# Altium footprint library SWARMUS_LIB.PcbLib: 114 footprints (part 2 of 8)
Each footprint in its own frame and in the unit in brackets; x right, y up, seen from the top. Pads: shape width x height; smd on the part's side, far side on the other; paste and mask are expansions set on the pad; w line width, h text height; cw(c..) or ccw(c..) is an arc to the next point about the centre after c.
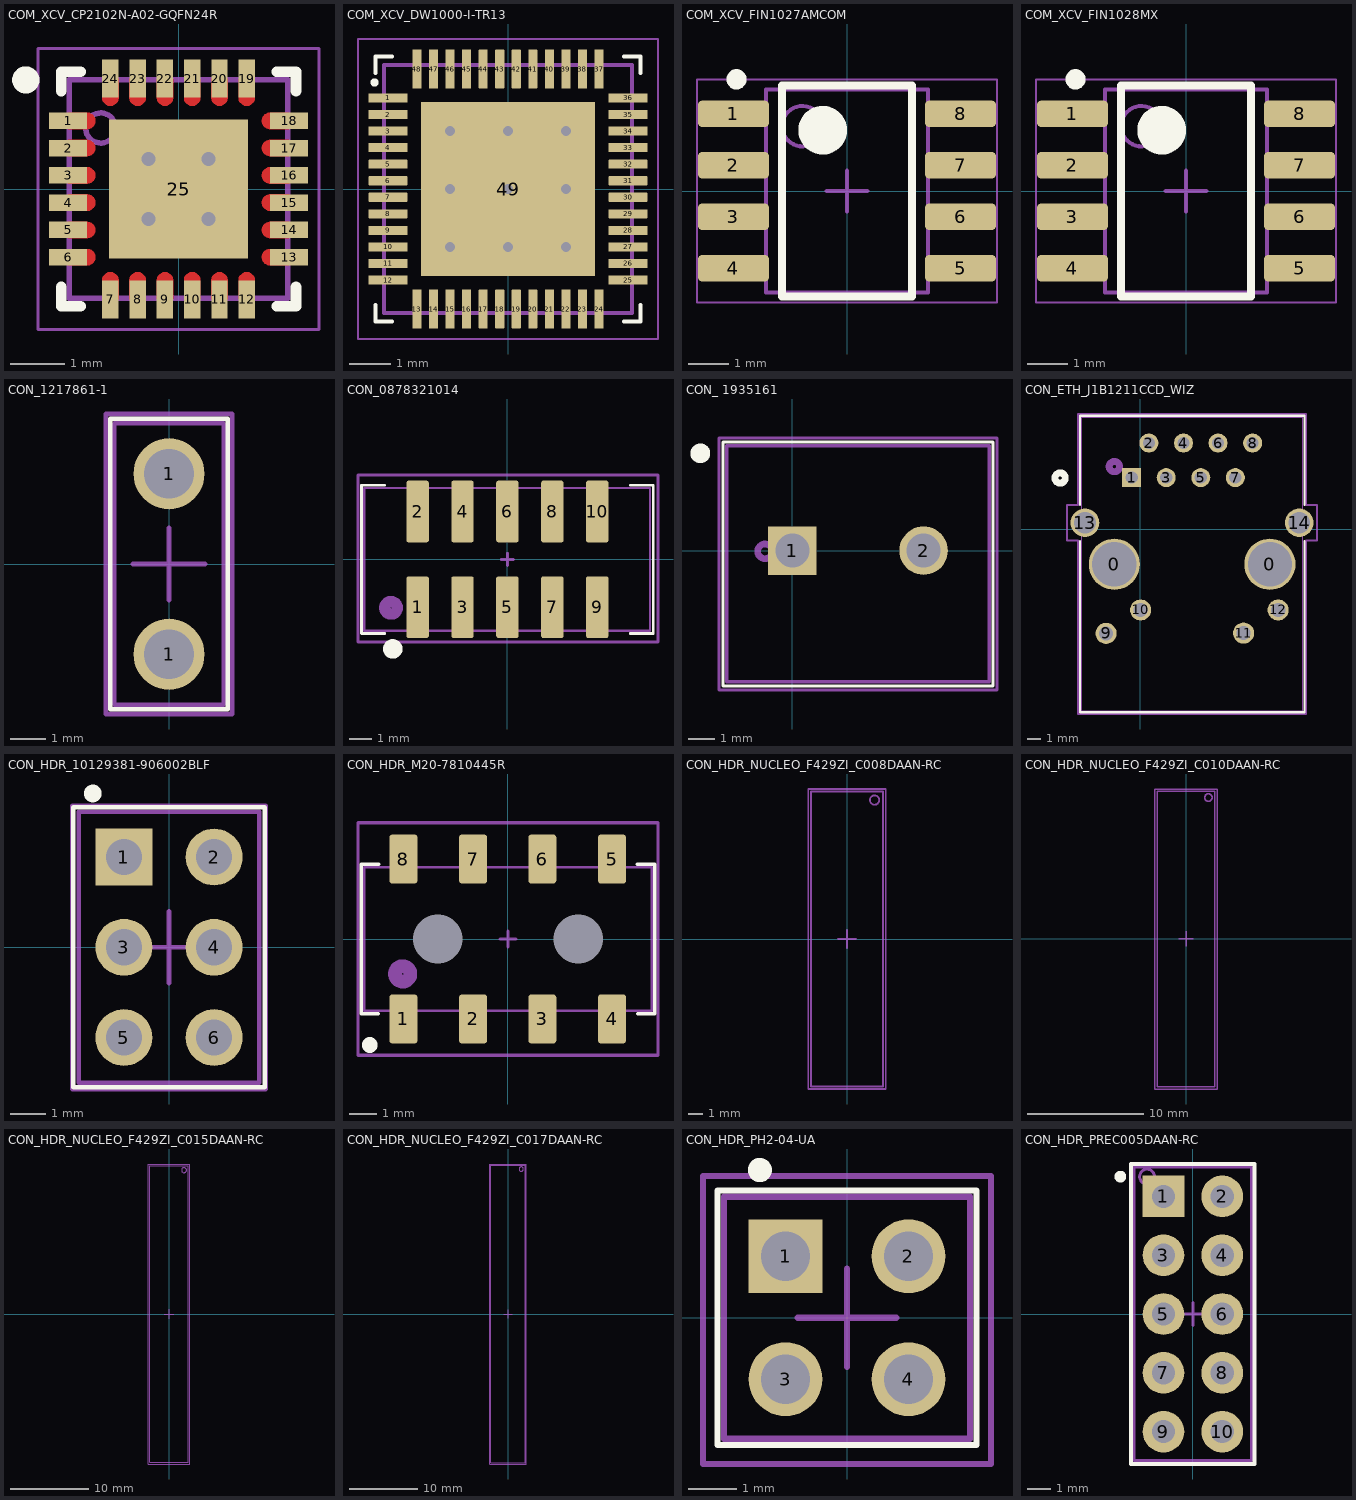
[diagram p1: the footprints below, top view; thin cyan lines are the x and y axes]

## COM_XCV_CP2102N-A02-GQFN24R [mm] "QFN, 24-Leads, Body 4.00x4.00mm, Pitch 0.50mm, Thermal Pad 2.55x2.55mm, IPC Medium Density"
height 0.8
pads (25):
  rect 0.7x0.3 smd paste-0.025 mask+0.05: 1(-2.025,1.25) 2(-2.025,0.75) 3(-2.025,0.25) 4(-2.025,-0.25) 5(-2.025,-0.75) 6(-2.025,-1.25) 13(2.025,-1.25) 14(2.025,-0.75) 15(2.025,-0.25) 16(2.025,0.25) 17(2.025,0.75) 18(2.025,1.25)
  rect 0.3x0.7 smd paste-0.025 mask+0.05: 7(-1.25,-2.025) 8(-0.75,-2.025) 9(-0.25,-2.025) 10(0.25,-2.025) 11(0.75,-2.025) 12(1.25,-2.025) 19(1.25,2.025) 20(0.75,2.025) 21(0.25,2.025) 22(-0.25,2.025) 23(-0.75,2.025) 24(-1.25,2.025)
  rect 2.55x2.55 smd paste-0.025 mask+0.05: 25(0,0)
via -0.55,0.55 diameter 0.508 hole 0.254
via 0.55,0.55 diameter 0.508 hole 0.254
via -0.55,-0.55 diameter 0.508 hole 0.254
via 0.55,-0.55 diameter 0.508 hole 0.254
Top Layer:
  region: -1.675,-1.4 -1.66,-1.4 -1.631,-1.394 -1.604,-1.383 -1.579,-1.367 -1.558,-1.346 -1.542,-1.321 -1.531,-1.294 -1.525,-1.265 -1.525,-1.235 -1.531,-1.206 -1.542,-1.179 -1.558,-1.154 -1.579,-1.133 -1.604,-1.117 -1.631,-1.106 -1.66,-1.1 -1.675,-1.1 -2.025,-1.1 -2.025,-1.4
  region: 0.6,1.675 0.6,1.66 0.606,1.631 0.617,1.604 0.633,1.579 0.654,1.558 0.679,1.542 0.706,1.531 0.735,1.525 0.765,1.525 0.794,1.531 0.821,1.542 0.846,1.558 0.867,1.579 0.883,1.604 0.894,1.631 0.9,1.66 0.9,1.675 0.9,2.025 0.6,2.025
  region: 0.1,1.675 0.1,1.66 0.106,1.631 0.117,1.604 0.133,1.579 0.154,1.558 0.179,1.542 0.206,1.531 0.235,1.525 0.265,1.525 0.294,1.531 0.321,1.542 0.346,1.558 0.367,1.579 0.383,1.604 0.394,1.631 0.4,1.66 0.4,1.675 0.4,2.025 0.1,2.025
  region: -0.4,1.675 -0.4,1.66 -0.394,1.631 -0.383,1.604 -0.367,1.579 -0.346,1.558 -0.321,1.542 -0.294,1.531 -0.265,1.525 -0.235,1.525 -0.206,1.531 -0.179,1.542 -0.154,1.558 -0.133,1.579 -0.117,1.604 -0.106,1.631 -0.1,1.66 -0.1,1.675 -0.1,2.025 -0.4,2.025
  region: -0.9,1.675 -0.9,1.66 -0.894,1.631 -0.883,1.604 -0.867,1.579 -0.846,1.558 -0.821,1.542 -0.794,1.531 -0.765,1.525 -0.735,1.525 -0.706,1.531 -0.679,1.542 -0.654,1.558 -0.633,1.579 -0.617,1.604 -0.606,1.631 -0.6,1.66 -0.6,1.675 -0.6,2.025 -0.9,2.025
  region: -1.4,1.675 -1.4,1.66 -1.394,1.631 -1.383,1.604 -1.367,1.579 -1.346,1.558 -1.321,1.542 -1.294,1.531 -1.265,1.525 -1.235,1.525 -1.206,1.531 -1.179,1.542 -1.154,1.558 -1.133,1.579 -1.117,1.604 -1.106,1.631 -1.1,1.66 -1.1,1.675 -1.1,2.025 -1.4,2.025
  region: 1.1,1.675 1.1,1.66 1.106,1.631 1.117,1.604 1.133,1.579 1.154,1.558 1.179,1.542 1.206,1.531 1.235,1.525 1.265,1.525 1.294,1.531 1.321,1.542 1.346,1.558 1.367,1.579 1.383,1.604 1.394,1.631 1.4,1.66 1.4,1.675 1.4,2.025 1.1,2.025
  region: 1.675,-0.6 1.66,-0.6 1.631,-0.606 1.604,-0.617 1.579,-0.633 1.558,-0.654 1.542,-0.679 1.531,-0.706 1.525,-0.735 1.525,-0.765 1.531,-0.794 1.542,-0.821 1.558,-0.846 1.579,-0.867 1.604,-0.883 1.631,-0.894 1.66,-0.9 1.675,-0.9 2.025,-0.9 2.025,-0.6
  region: 1.675,-0.1 1.66,-0.1 1.631,-0.106 1.604,-0.117 1.579,-0.133 1.558,-0.154 1.542,-0.179 1.531,-0.206 1.525,-0.235 1.525,-0.265 1.531,-0.294 1.542,-0.321 1.558,-0.346 1.579,-0.367 1.604,-0.383 1.631,-0.394 1.66,-0.4 1.675,-0.4 2.025,-0.4 2.025,-0.1
  region: 1.675,0.4 1.66,0.4 1.631,0.394 1.604,0.383 1.579,0.367 1.558,0.346 1.542,0.321 1.531,0.294 1.525,0.265 1.525,0.235 1.531,0.206 1.542,0.179 1.558,0.154 1.579,0.133 1.604,0.117 1.631,0.106 1.66,0.1 1.675,0.1 2.025,0.1 2.025,0.4
  region: 1.675,0.9 1.66,0.9 1.631,0.894 1.604,0.883 1.579,0.867 1.558,0.846 1.542,0.821 1.531,0.794 1.525,0.765 1.525,0.735 1.531,0.706 1.542,0.679 1.558,0.654 1.579,0.633 1.604,0.617 1.631,0.606 1.66,0.6 1.675,0.6 2.025,0.6 2.025,0.9
  region: 1.675,1.4 1.66,1.4 1.631,1.394 1.604,1.383 1.579,1.367 1.558,1.346 1.542,1.321 1.531,1.294 1.525,1.265 1.525,1.235 1.531,1.206 1.542,1.179 1.558,1.154 1.579,1.133 1.604,1.117 1.631,1.106 1.66,1.1 1.675,1.1 2.025,1.1 2.025,1.4
  region: 1.675,-1.1 1.66,-1.1 1.631,-1.106 1.604,-1.117 1.579,-1.133 1.558,-1.154 1.542,-1.179 1.531,-1.206 1.525,-1.235 1.525,-1.265 1.531,-1.294 1.542,-1.321 1.558,-1.346 1.579,-1.367 1.604,-1.383 1.631,-1.394 1.66,-1.4 1.675,-1.4 2.025,-1.4 2.025,-1.1
  region: -0.6,-1.675 -0.6,-1.66 -0.606,-1.631 -0.617,-1.604 -0.633,-1.579 -0.654,-1.558 -0.679,-1.542 -0.706,-1.531 -0.735,-1.525 -0.765,-1.525 -0.794,-1.531 -0.821,-1.542 -0.846,-1.558 -0.867,-1.579 -0.883,-1.604 -0.894,-1.631 -0.9,-1.66 -0.9,-1.675 -0.9,-2.025 -0.6,-2.025
  region: -0.1,-1.675 -0.1,-1.66 -0.106,-1.631 -0.117,-1.604 -0.133,-1.579 -0.154,-1.558 -0.179,-1.542 -0.206,-1.531 -0.235,-1.525 -0.265,-1.525 -0.294,-1.531 -0.321,-1.542 -0.346,-1.558 -0.367,-1.579 -0.383,-1.604 -0.394,-1.631 -0.4,-1.66 -0.4,-1.675 -0.4,-2.025 -0.1,-2.025
  region: 0.4,-1.675 0.4,-1.66 0.394,-1.631 0.383,-1.604 0.367,-1.579 0.346,-1.558 0.321,-1.542 0.294,-1.531 0.265,-1.525 0.235,-1.525 0.206,-1.531 0.179,-1.542 0.154,-1.558 0.133,-1.579 0.117,-1.604 0.106,-1.631 0.1,-1.66 0.1,-1.675 0.1,-2.025 0.4,-2.025
  region: 0.9,-1.675 0.9,-1.66 0.894,-1.631 0.883,-1.604 0.867,-1.579 0.846,-1.558 0.821,-1.542 0.794,-1.531 0.765,-1.525 0.735,-1.525 0.706,-1.531 0.679,-1.542 0.654,-1.558 0.633,-1.579 0.617,-1.604 0.606,-1.631 0.6,-1.66 0.6,-1.675 0.6,-2.025 0.9,-2.025
  region: 1.4,-1.675 1.4,-1.66 1.394,-1.631 1.383,-1.604 1.367,-1.579 1.346,-1.558 1.321,-1.542 1.294,-1.531 1.265,-1.525 1.235,-1.525 1.206,-1.531 1.179,-1.542 1.154,-1.558 1.133,-1.579 1.117,-1.604 1.106,-1.631 1.1,-1.66 1.1,-1.675 1.1,-2.025 1.4,-2.025
  region: -1.1,-1.675 -1.1,-1.66 -1.106,-1.631 -1.117,-1.604 -1.133,-1.579 -1.154,-1.558 -1.179,-1.542 -1.206,-1.531 -1.235,-1.525 -1.265,-1.525 -1.294,-1.531 -1.321,-1.542 -1.346,-1.558 -1.367,-1.579 -1.383,-1.604 -1.394,-1.631 -1.4,-1.66 -1.4,-1.675 -1.4,-2.025 -1.1,-2.025
  region: -1.675,0.6 -1.66,0.6 -1.631,0.606 -1.604,0.617 -1.579,0.633 -1.558,0.654 -1.542,0.679 -1.531,0.706 -1.525,0.735 -1.525,0.765 -1.531,0.794 -1.542,0.821 -1.558,0.846 -1.579,0.867 -1.604,0.883 -1.631,0.894 -1.66,0.9 -1.675,0.9 -2.025,0.9 -2.025,0.6
  region: -1.675,0.1 -1.66,0.1 -1.631,0.106 -1.604,0.117 -1.579,0.133 -1.558,0.154 -1.542,0.179 -1.531,0.206 -1.525,0.235 -1.525,0.265 -1.531,0.294 -1.542,0.321 -1.558,0.346 -1.579,0.367 -1.604,0.383 -1.631,0.394 -1.66,0.4 -1.675,0.4 -2.025,0.4 -2.025,0.1
  region: -1.675,-0.4 -1.66,-0.4 -1.631,-0.394 -1.604,-0.383 -1.579,-0.367 -1.558,-0.346 -1.542,-0.321 -1.531,-0.294 -1.525,-0.265 -1.525,-0.235 -1.531,-0.206 -1.542,-0.179 -1.558,-0.154 -1.579,-0.133 -1.604,-0.117 -1.631,-0.106 -1.66,-0.1 -1.675,-0.1 -2.025,-0.1 -2.025,-0.4
  region: -1.675,-0.9 -1.66,-0.9 -1.631,-0.894 -1.604,-0.883 -1.579,-0.867 -1.558,-0.846 -1.542,-0.821 -1.531,-0.794 -1.525,-0.765 -1.525,-0.735 -1.531,-0.706 -1.542,-0.679 -1.558,-0.654 -1.579,-0.633 -1.604,-0.617 -1.631,-0.606 -1.66,-0.6 -1.675,-0.6 -2.025,-0.6 -2.025,-0.9
  region: -1.675,1.1 -1.66,1.1 -1.631,1.106 -1.604,1.117 -1.579,1.133 -1.558,1.154 -1.542,1.179 -1.531,1.206 -1.525,1.235 -1.525,1.265 -1.531,1.294 -1.542,1.321 -1.558,1.346 -1.579,1.367 -1.604,1.383 -1.631,1.394 -1.66,1.4 -1.675,1.4 -2.025,1.4 -2.025,1.1
Top Overlay:
  circle w0.25: c-2.8,2 r0.125
  lines w0.2: -2.15,-1.8 -2.15,-2.15 -1.8,-2.15 ; -2.15,1.8 -2.15,2.15 -1.8,2.15 ; 1.8,-2.15 2.15,-2.15 2.15,-1.8 ; 1.8,2.15 2.15,2.15 2.15,1.8
Top Solder:
  drawing of 24 lines, arcs and shapes, not listed
Top Assembly Drawing:
  circle w0.1: c-1.427,1.118 r0.276
  lines w0.1: -2,-2 -2,2 2,2 2,-2 -2,-2
Top Courtyard:
  lines w0.05: -2.575,-2.575 -2.575,2.575 2.575,2.575 2.575,-2.575 -2.575,-2.575
  lines w0.1: -0.5,0 0.5,0 ; 0,-0.5 0,0.5
3D body: height 0.8, standoff 0, extent -2,-2 2,2

## COM_XCV_DW1000-I-TR13 [mm] "QFN 48 package, 0.5mm pitch"
height 1
pads (49):
  rrect20% 0.95x0.22 smd paste-0.025 mask+0.04: 1(-2.9,2.2) 2(-2.9,1.8) 3(-2.9,1.4) 4(-2.9,1) 5(-2.9,0.6) 6(-2.9,0.2) 7(-2.9,-0.2) 8(-2.9,-0.6) 9(-2.9,-1) 10(-2.9,-1.4) 11(-2.9,-1.8) 12(-2.9,-2.2) 25(2.9,-2.2) 26(2.9,-1.8) 27(2.9,-1.4) 28(2.9,-1) 29(2.9,-0.6) 30(2.9,-0.2) 31(2.9,0.2) 32(2.9,0.6) 33(2.9,1) 34(2.9,1.4) 35(2.9,1.8) 36(2.9,2.2)
  rrect20% 0.22x0.95 smd paste-0.025 mask+0.04: 13(-2.2,-2.9) 14(-1.8,-2.9) 15(-1.4,-2.9) 16(-1,-2.9) 17(-0.6,-2.9) 18(-0.2,-2.9) 19(0.2,-2.9) 20(0.6,-2.9) 21(1,-2.9) 22(1.4,-2.9) 23(1.8,-2.9) 24(2.2,-2.9) 37(2.2,2.9) 38(1.8,2.9) 39(1.4,2.9) 40(1,2.9) 41(0.6,2.9) 42(0.2,2.9) 43(-0.2,2.9) 44(-0.6,2.9) 45(-1,2.9) 46(-1.4,2.9) 47(-1.8,2.9) 48(-2.2,2.9)
  rect 4.2x4.2 smd paste-5 mask+0.07: 49(0,0)
via 1.4,1.4 diameter 0.5 hole 0.25
via 1.4,0 diameter 0.5 hole 0.25
via 1.4,-1.4 diameter 0.5 hole 0.25
via 0,-1.4 diameter 0.5 hole 0.25
via -1.4,-1.4 diameter 0.5 hole 0.25
via -1.4,-0.002 diameter 0.5 hole 0.25
via -1.4,1.4 diameter 0.5 hole 0.25
via 0,1.4 diameter 0.5 hole 0.25
via 0,0 diameter 0.5 hole 0.25
Top Overlay:
  circle w0.1: c-3.225,2.575 r0.05
  lines w0.1: -3.2,-2.8 -3.2,-3.2 -2.8,-3.2 ; -3.2,2.8 -3.2,3.2 -2.8,3.2 ; 2.8,-3.2 3.2,-3.2 3.2,-2.8 ; 2.8,3.2 3.2,3.2 3.2,2.8
Top Paste:
  region: 0.175,-0.175 0.175,-1.925 1.925,-1.925 1.925,-0.175
  region: -0.175,-0.175 -1.925,-0.175 -1.925,-1.925 -0.175,-1.925
  region: -0.175,0.175 -0.175,1.925 -1.925,1.925 -1.925,0.175
  rectangle: 0.175,0.175 1.925,1.925
Top Assembly Drawing:
  circle w0.1: c-2.6,2.2 r0.05
  lines w0.1: -3,-3 -3,3 3,3 3,-3 -3,-3
Top Courtyard:
  lines w0.05: -3.625,-3.625 3.625,-3.625 3.625,3.625 -3.625,3.625 -3.625,-3.625
  lines w0.1: 0,0.2 0,-0.2 0,0 -0.2,0 0.2,0 ; 0.201,0 0.202,-0.002
3D body "DW1000-I-TR13.stp": height 0.9, standoff 0, extent -3.05,-3.05 3.05,3.05

## COM_XCV_FIN1027AMCOM [mm] "8-SOIC"
height 1.75
pads (8):
  rrect30% 1.75x0.65 smd paste-0.025 mask+0.07: 1(-2.8,1.905) 2(-2.8,0.635) 3(-2.8,-0.635) 4(-2.8,-1.905) 5(2.8,-1.905) 6(2.8,-0.635) 7(2.8,0.635) 8(2.8,1.905)
Top Overlay:
  circle w0.6: c-0.6,1.5 r0.3
  circle w0.25: c-2.725,2.755 r0.125
  lines w0.2: -1.6,-2.6 1.6,-2.6 1.6,2.6 -1.6,2.6 -1.6,-2.6
Top Assembly Drawing:
  circle w0.1: c-1.1,1.6 r0.5
  lines w0.1: -2,-2.5 2,-2.5 2,2.5 -2,2.5 -2,-2.5
Top Courtyard:
  lines w0.05: -3.7,-2.75 3.7,-2.75 3.7,2.75 -3.7,2.75 -3.7,-2.75
  lines w0.1: -0.5,0 0.5,0 ; 0,-0.5 0,0.5
3D body "SOIC127P600X175-8N.step": height 1.75, standoff 0, extent -3,-2.5 3,2.5

## COM_XCV_FIN1028MX [mm] "8-SOIC"
height 1.75
pads (8):
  rrect30% 1.75x0.65 smd paste-0.025 mask+0.07: 1(-2.8,1.905) 2(-2.8,0.635) 3(-2.8,-0.635) 4(-2.8,-1.905) 5(2.8,-1.905) 6(2.8,-0.635) 7(2.8,0.635) 8(2.8,1.905)
Top Overlay:
  circle w0.25: c-2.725,2.755 r0.125
  circle w0.6: c-0.6,1.5 r0.3
  lines w0.2: -1.6,-2.6 -1.6,2.6 1.6,2.6 1.6,-2.6 -1.6,-2.6
Top Assembly Drawing:
  circle w0.1: c-1.1,1.6 r0.5
  lines w0.1: -2,-2.5 -2,2.5 2,2.5 2,-2.5 -2,-2.5
Top Courtyard:
  lines w0.05: -3.7,-2.75 -3.7,2.75 3.7,2.75 3.7,-2.75 -3.7,-2.75
  lines w0.1: -0.5,0 0.5,0 ; 0,-0.5 0,0.5
3D body "SOIC127P600X175-8N.step": height 1.75, standoff 0, extent -3,-2.5 3,2.5

## CON_1217861-1 [mm]
pads (2):
  round 2 hole 1.4: 1(0,-2.54) 1(0,2.54)
Top Overlay:
  lines w0.127: -1.65,-4.091 1.65,-4.091 1.65,4.091 -1.65,4.091 -1.65,-4.091
Top Assembly Drawing:
  lines w0.127: -1.543,-3.962 1.543,-3.962 1.543,3.962 -1.543,3.962 -1.543,-3.962
Top Courtyard:
  lines w0.127: -1.016,0 1.016,0 ; 0,-1.016 0,1.016 ; -1.779,-4.222 1.779,-4.222 1.779,4.222 -1.779,4.222 -1.779,-4.222
3D body "1217861-1--3DModel-STEP-1.STEP": height 10.21, standoff -3.81, extent -1.543,-3.962 1.543,3.962

## CON_0878321014 [mm]
pads (10):
  rrect20% 1x2.75 smd: 1(-4,-2.13) 2(-4,2.13) 3(-2,-2.13) 4(-2,2.13) 5(0,-2.13) 6(0,2.13) 7(2,-2.13) 8(2,2.13) 9(4,-2.13) 10(4,2.13)
Top Overlay:
  circle w0.5: c-5.105,-3.988 r0.184
  lines w0.127: -5.467,-3.302 -6.492,-3.302 -6.492,3.302 -5.467,3.302 ; 5.467,-3.302 6.492,-3.302 6.492,3.302 5.467,3.302
Top Assembly Drawing:
  circle w0.5: c-5.182,-2.159 r0.279
  lines w0.1: -6.375,-3.175 6.35,-3.175 6.35,3.175 -6.375,3.175 -6.375,-3.175
Top Courtyard:
  lines w0.127: -0.275,0 0.275,0 ; 0,-0.275 0,0.275 ; -6.655,-3.683 -6.655,3.759 6.706,3.759 6.706,-3.683 -6.655,-3.683
3D body "878321014.stp": height 9.05, standoff 0, extent -6.325,-3.175 6.325,3.175

## CON_ 1935161 [mm]
pads (2):
  rect 1.85x1.85 hole 1.3: 1(0,0)
  round 1.85 hole 1.3: 2(5,0)
Top Overlay:
  circle w0.5: c-3.505,3.708 r0.127
  lines w0.127: -2.642,-5.156 7.645,-5.156 7.645,4.14 -2.642,4.14 -2.642,-5.156
Top Assembly Drawing:
  circle w0.254: c-1.041,-0.025 r0.281
  lines w0.127: -2.5,-5 7.5,-5 7.5,4 -2.5,4 -2.5,-5
Top Courtyard:
  lines w0.127: -2.794,-5.309 7.798,-5.309 7.798,4.293 -2.794,4.293 -2.794,-5.309
3D body "pxc_1935161_04_PT-1-5-2-5-0-H_3D.stp": height 11.4, standoff -3.5, extent -2.5,-5 8.07,4

## CON_ETH_J1B1211CCD_WIZ [mil] "ETH with mags"
pads (16):
  round 148 hole 128: 0(-75,-101.57) 0(375,-101.57)
  rect 55x55 / inner round 55 / far side round 55 hole 35.43 mask+0: 1(-25,149.21)
  round 55 hole 35.43 mask+0: 2(25,249.21) 3(75,149.21) 4(125,249.21) 5(175,149.21) 6(225,249.21) 7(275,149.21) 8(325,249.21)
  round 61 hole 41: 9(-99.02,-301.57) 10(0.98,-233.86) 11(299.02,-300.79) 12(399.02,-233.86)
  round 83 hole 63: 13(-160.04,18.5) 14(460.04,18.5)
Top Overlay:
  circle w20: c-232,148 r15
  lines w6: -175,-34.01 -175,-529.79 475,-529.79 475,-34.01 ; -175,70 -175,328.21 475,328.21 475,70
Top 3D Model:
  circle w20: c-75,181 r15
  lines w1: -170,-524.79 470,-524.79 470,323.21 -170,323.21 -170,-524.79
Top Courtyard:
  lines w6: -211.54,-33 -211.54,70 -180,70 -180,333.21 480,333.21 480,70 511.54,70 511.54,-33 480,-33 480,-534.79 -180,-534.79 -180,-33 -211.54,-33
3D body: height 10, standoff 0, extent 0,0 10,10
3D body "J1B1211CCD.STEP": height 565.33, standoff -155.51, extent -203.69,-525.29 505.7,313.29

## CON_HDR_10129381-906002BLF [mm] "2x3 100mils header"
pads (6):
  rect 1.6x1.6 hole 1.016 mask+0.07: 1(-1.27,2.54)
  round 1.6 hole 1.016 mask+0.07: 2(1.27,2.54) 3(-1.27,0) 4(1.27,0) 5(-1.27,-2.54) 6(1.27,-2.54)
Top Overlay:
  circle w0.25: c-2.144,4.329 r0.125
  lines w0.127: -2.692,-3.937 -2.692,3.937 2.692,3.937 2.692,-3.937 -2.692,-3.937
Top Assembly Drawing:
  lines w0.127: -2.54,-3.81 -2.54,3.81 2.54,3.81 2.54,-3.81 -2.54,-3.81
Top Courtyard:
  lines w0.127: -1.016,0 1.016,0 ; 0,-1.016 0,1.016 ; -2.718,-3.988 2.718,-3.988 2.718,3.988 -2.718,3.988 -2.718,-3.988
3D body "s10129381-X06002XLF.stp": height 8.18, standoff -2.49, extent -2.415,-3.81 2.415,3.81

## CON_HDR_M20-7810445R [mm]
pads (10):
  rrect20% 1.02x1.78 smd paste-0.025 mask+0.07: 1(-3.81,-2.91) 2(-1.27,-2.911) 3(1.248,-2.911) 4(3.788,-2.911) 5(3.788,2.91) 6(1.248,2.91) 7(-1.27,2.91) 8(-3.81,2.91)
  round 1 hole 1.8: ""(-2.554,0) ""(2.554,0)
Top Overlay:
  circle w0.5: c-5.029,-3.861 r0.036
  lines w0.127: -4.73,-2.718 -5.334,-2.718 -5.334,2.718 -4.705,2.718 ; 4.705,2.718 5.334,2.718 5.334,-2.718 4.73,-2.718
Top Assembly Drawing:
  circle w0.5: c-3.835,-1.27 r0.279
  lines w0.1: -5.23,-2.615 5.23,-2.615 5.23,2.615 -5.23,2.615 -5.23,-2.615
Top Courtyard:
  lines w0.127: -0.275,0 0.275,0 ; 0,-0.275 0,0.275 ; -5.461,-4.225 5.461,-4.225 5.461,4.225 -5.461,4.225 -5.461,-4.225
3D body "M20-7810445R_v1 v1.step": height 3.75, standoff -1.4, extent -5.08,-3.625 5.08,3.575

## CON_HDR_NUCLEO_F429ZI_C008DAAN-RC [mm]
Top Assembly Drawing:
  circle w0.127: c1.9,9.575 r0.322
  lines w0.127: -0.635,0 0.635,0 ; 0,-0.635 0,0.635 ; -2.476,-10.16 -2.476,10.16 2.476,10.16 2.476,-10.16 -2.476,-10.16
Top Courtyard:
  lines w0.127: -2.667,-10.338 -2.667,10.338 2.667,10.338 2.667,-10.338 -2.667,-10.338
3D body "C008DAAN-RC.STEP": height 8.37, standoff -3.02, extent -2.5,-10.16 2.5,10.16

## CON_HDR_NUCLEO_F429ZI_C010DAAN-RC [mm]
Top Assembly Drawing:
  circle w0.127: c1.93,12.141 r0.322
  lines w0.127: -0.635,0 0.635,0 ; 0,-0.635 0,0.635 ; -2.476,-12.7 2.476,-12.7 2.476,12.7 -2.476,12.7 -2.476,-12.7
Top Courtyard:
  lines w0.127: -2.667,-12.903 2.667,-12.903 2.667,12.878 -2.667,12.878 -2.667,-12.903
3D body "C010DAAN-RC.STEP": height 8.37, standoff -3.02, extent -2.5,-12.7 2.5,12.7

## CON_HDR_NUCLEO_F429ZI_C015DAAN-RC [mm]
Top Assembly Drawing:
  circle w0.127: c1.93,18.466 r0.322
  lines w0.127: -0.635,0 0.635,0 ; 0,-0.635 0,0.635 ; -2.476,-19.05 -2.476,19.05 2.476,19.05 2.476,-19.05 -2.476,-19.05
Top Courtyard:
  lines w0.127: -2.667,-19.253 -2.667,19.253 2.667,19.253 2.667,-19.253 -2.667,-19.253
3D body "C015DAAN-RC.STEP": height 8.37, standoff -3.02, extent -2.5,-19.05 2.5,19.05

## CON_HDR_NUCLEO_F429ZI_C017DAAN-RC [mm]
Top Assembly Drawing:
  circle w0.127: c1.93,21.082 r0.322
  lines w0.127: -0.635,0 0.635,0 ; 0,-0.635 0,0.635 ; -2.476,-21.59 2.476,-21.59 2.476,21.641 -2.476,21.641 -2.476,-21.59
Top Courtyard:
  lines w0.127: -2.667,-21.793 2.667,-21.793 2.667,21.819 -2.667,21.819 -2.667,-21.793
3D body "C017DAAN-RC.STEP": height 8.37, standoff -3.02, extent -2.5,-21.59 2.5,21.59

## CON_HDR_PH2-04-UA [mil]
pads (4):
  rect 60x60 hole 40: 1(-50,50)
  round 60 hole 40: 2(50,50) 3(-50,-50) 4(50,-50)
Top Overlay:
  circle w9.84: c-70.87,120.08 r4.92
  lines w5: -105.31,-103.35 -105.31,103.35 105.31,103.35 105.31,-103.35 -105.31,-103.35
Top Assembly Drawing:
  lines w5: -100,-98.43 100,-98.43 100,98.43 -100,98.43 -100,-98.43
Top Courtyard:
  lines w5: -40,0 40,0 ; 0,-40 0,40 ; -117.13,-118.92 117.13,-118.92 117.13,115.16 -117.13,115.16 -117.13,-118.92
3D body "PH2-04-UA.STEP": height 334.65, standoff -120.08, extent -100,-98.43 100,98.43

## CON_HDR_PREC005DAAN-RC [mm] "18 pin header 100 mils"
pads (10):
  rect 1.8x1.8 hole 1: 1(-1.27,5.08)
  round 1.8 hole 1: 2(1.27,5.08) 3(-1.27,2.54) 4(1.27,2.54) 5(-1.27,0) 6(1.27,0) 7(-1.27,-2.54) 8(1.27,-2.54) 9(-1.27,-5.08) 10(1.27,-5.08)
Top Overlay:
  circle w0.25: c-3.132,5.931 r0.127
  lines w0.178: -2.667,-6.477 2.667,-6.477 2.667,6.477 -2.667,6.477 -2.667,-6.477
Top Assembly Drawing:
  circle w0.127: c-1.977,5.931 r0.322
  lines w0.127: -0.5,0 0.5,0 ; 0,-0.5 0,0.5 ; -2.54,-6.32 2.54,-6.32 2.54,6.35 -2.54,6.35 -2.54,-6.32
Top Courtyard:
  lines w0.127: -2.667,-6.477 2.667,-6.477 2.667,6.477 -2.667,6.477 -2.667,-6.477
3D body "PREC009DAAN.step": height 8.43, standoff -2.94, extent -2.54,-6.35 2.54,6.35